# Altium footprint library Footprint.PcbLib: 55 footprints (part 2 of 4)
Each footprint in its own frame and in the unit in brackets; x right, y up, seen from the top. Pads: shape width x height; smd on the part's side, far side on the other; paste and mask are expansions set on the pad; w line width, h text height; cw(c..) or ccw(c..) is an arc to the next point about the centre after c.
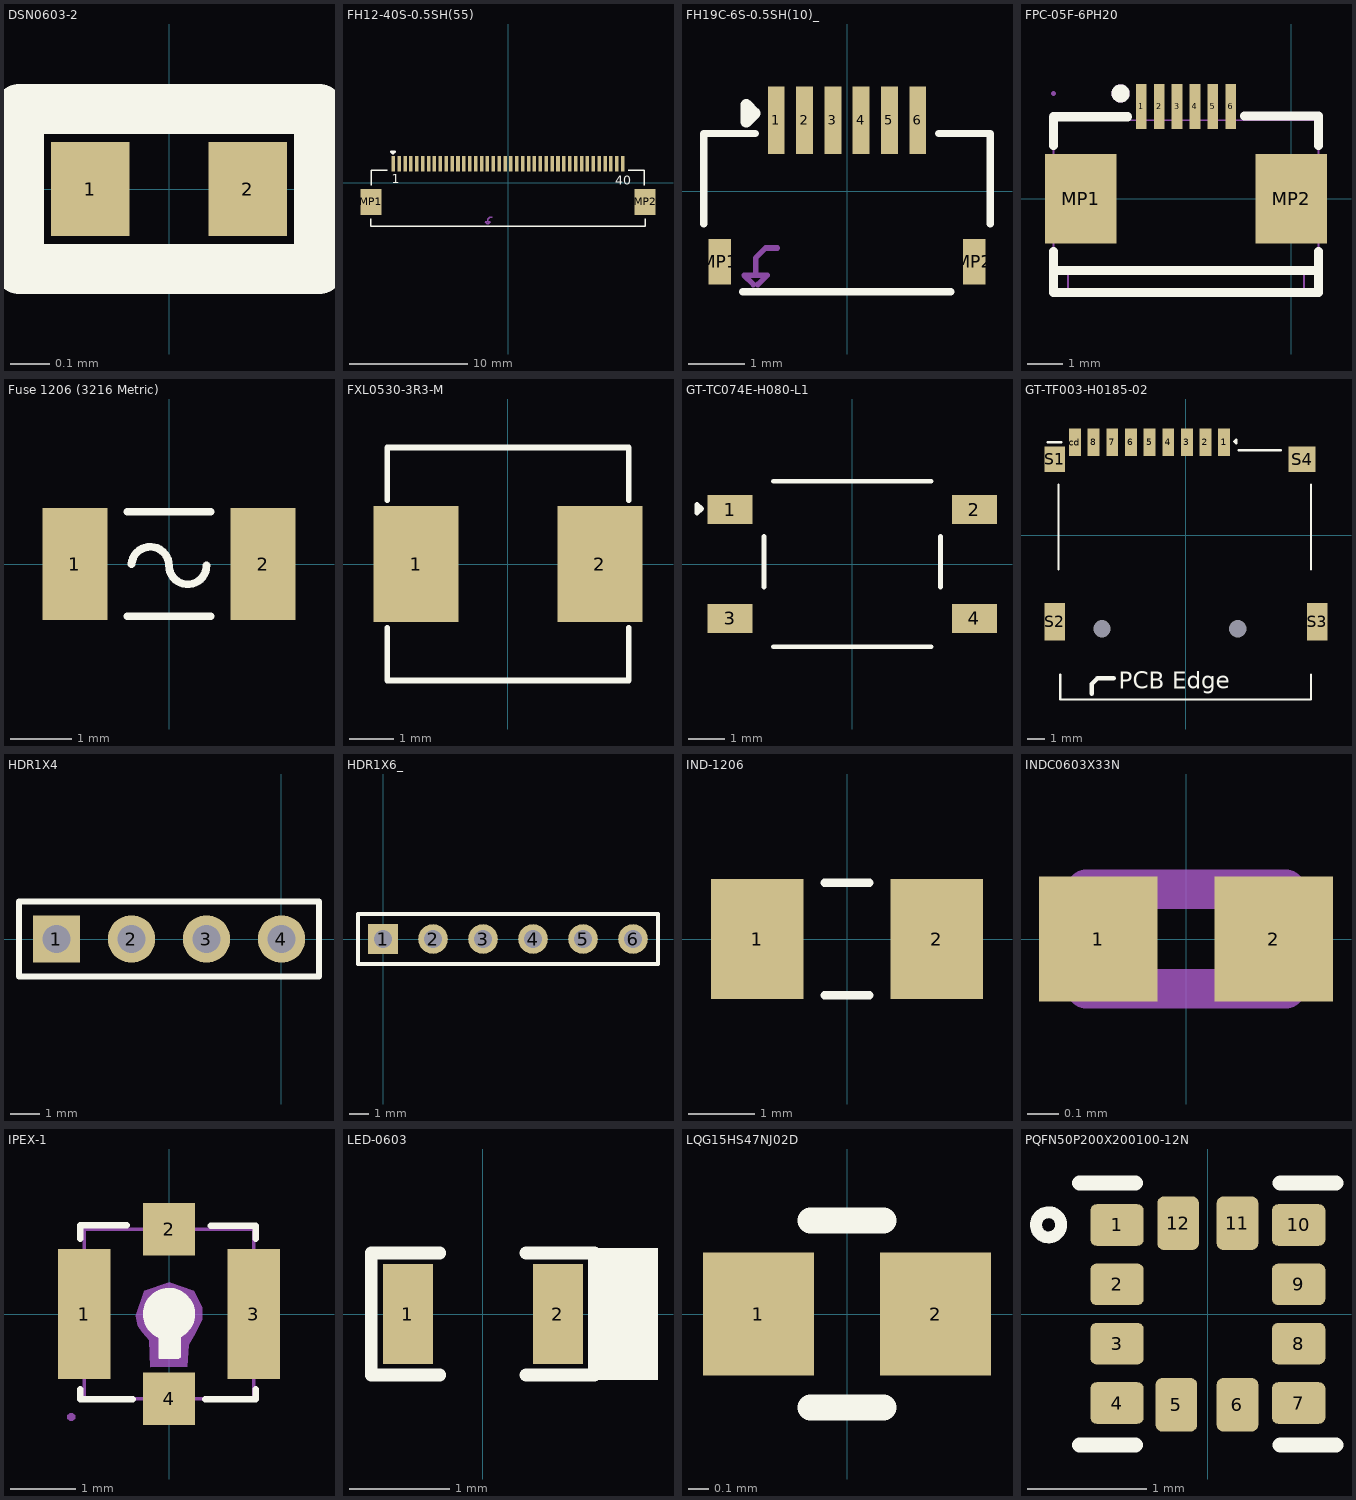
[diagram p1: the footprints below, top view; thin cyan lines are the x and y axes]

## DSN0603-2 [mm]
pads (2):
  rect 0.2x0.24 smd mask+0.055: 1(-0.2,0) 2(0.2,0)
Top Overlay:
  lines w0.127: -0.381,-0.203 -0.381,0.203 0.381,0.203 0.381,-0.203 -0.381,-0.203
3D body "PESD5V0H1BSF.STEP": height 0.32, standoff 0, extent -0.3,-0.15 0.3,0.15

## FH12-40S-0.5SH(55) [mm]
pads (42):
  rect 0.3x1.3 smd: 1(-9.75,1.625) 2(-9.25,1.625) 3(-8.75,1.625) 4(-8.25,1.625) 5(-7.75,1.625) 6(-7.25,1.625) 7(-6.75,1.625) 8(-6.25,1.625) 9(-5.75,1.625) 10(-5.25,1.625) 11(-4.75,1.625) 12(-4.25,1.625) 13(-3.75,1.625) 14(-3.25,1.625) 15(-2.75,1.625) 16(-2.25,1.625) 17(-1.75,1.625) 18(-1.25,1.625) 19(-0.75,1.625) 20(-0.25,1.625) 21(0.25,1.625) 22(0.75,1.625) 23(1.25,1.625) 24(1.75,1.625) 25(2.25,1.625) 26(2.75,1.625) 27(3.25,1.625) 28(3.75,1.625) 29(4.25,1.625) 30(4.75,1.625) 31(5.25,1.625) 32(5.75,1.625) 33(6.25,1.625) 34(6.75,1.625) 35(7.25,1.625) 36(7.75,1.625) 37(8.25,1.625) 38(8.75,1.625) 39(9.25,1.625) 40(9.75,1.625)
  rect 1.8x2.2 smd: MP1(-11.65,-1.625) MP2(11.65,-1.625)
Top Overlay:
  lines w0.127: -11.65,-3.049 -11.65,-3.708 11.65,-3.708 11.65,-3.049 ; -11.625,-0.201 -11.625,1.074 -10.25,1.074 ; 10.224,1.074 11.599,1.074 11.599,-0.201
  lines w0.2: -9.933,2.642 -9.628,2.642 -9.78,2.489 -9.933,2.642
  text "40" at 9.119,-0.152 h0.76
  text "1" at -9.881,-0.051 h0.76
Mechanical 13:
  lines w0.127: -1.346,-2.946 -1.549,-2.946 -1.727,-3.124 -1.727,-3.327 ; -1.727,-3.327 -1.524,-3.327 -1.687,-3.491 -1.767,-3.491 -1.93,-3.327 -1.727,-3.327
  text "PCB Edge" at -1.197,-3.276 h0.8
3D body "Conn_Hirose_FH12-40S-0_5SH_55_eec.STEP": height 4.8, standoff 0, extent -12.05,-3.654 12.05,1.746

## FH19C-6S-0.5SH(10)_ [mm]
pads (8):
  rect 0.3x1.2 smd: 1(-1.25,1.25) 2(-0.75,1.25) 3(-0.25,1.25) 4(0.25,1.25) 5(0.75,1.25) 6(1.25,1.25)
  rect 0.4x0.8 smd: MP1(-2.25,-1.25) MP2(2.25,-1.25)
Top Overlay:
  lines w0.127: -2.532,-0.584 -2.532,1.016 -1.618,1.016 ; -1.846,-1.778 1.837,-1.778 ; 1.618,1.016 2.532,1.016 2.532,-0.584
  lines w0.2: -1.778,1.219 -1.626,1.372 -1.778,1.524 -1.778,1.219
Mechanical 13:
  lines w0.1: -1.655,-1.651 -1.818,-1.488 -1.615,-1.488 ; -1.575,-1.651 -1.412,-1.488 -1.615,-1.488 ; -1.234,-1.005 -1.437,-1.005 -1.615,-1.183 -1.615,-1.488
  text "PCB Edge" at -1.135,-1.246 h0.6
3D body "FH19C-6S-0.5SH.stp": height 0.9, standoff 0, extent -2.503,-2.032 2.497,1.468

## FPC-05F-6PH20 [mm]
pads (8):
  rect 0.3x1.25 smd paste+0 mask+0.05: 1(-4.19,2.575) 2(-3.69,2.575) 3(-3.19,2.575) 4(-2.69,2.575) 5(-2.19,2.575) 6(-1.69,2.575)
  rect 2x2.5 smd paste+0 mask+0.05: MP1(-5.88,0) MP2(0,0)
Top Overlay:
  circle w0.254: c-4.767,2.939 r0.127
  lines w0.254: -6.64,-1.481 -6.64,-2.625 0.76,-2.625 0.76,-1.481 ; -6.64,1.481 -6.64,2.288 -4.571,2.288 ; -6.49,-2.012 0.76,-2.012 ; -1.309,2.304 0.76,2.304 0.76,1.481
Mechanical 6:
  circle w0.254: c-4.767,2.939 r0.127
Mechanical 15:
  region: -4.29,2.937 -4.29,2.087 -4.09,2.087 -4.09,2.937
  region: -3.79,2.937 -3.79,2.087 -3.59,2.087 -3.59,2.937
  region: -3.29,2.937 -3.29,2.087 -3.09,2.087 -3.09,2.937
  region: -2.79,2.937 -2.79,2.087 -2.59,2.087 -2.59,2.937
  region: -2.29,2.938 -2.29,2.088 -2.09,2.088 -2.09,2.938
  region: -1.79,2.938 -1.79,2.088 -1.59,2.088 -1.59,2.938
  region: -6.58,2.938 -6.581,2.962 -6.616,2.996 -6.664,2.996 -6.699,2.962 -6.7,2.937 -6.699,2.913 -6.664,2.879 -6.616,2.879 -6.581,2.913
  lines w0.051: -6.64,-2.012 -5.59,-2.012 -5.59,-2.062 -6.19,-2.062 -6.24,-2.112 -6.24,-2.612 -6.19,-2.662 0.31,-2.662 0.36,-2.612 0.36,-2.112 0.31,-2.062 -0.29,-2.062 -0.29,-2.012 0.76,-2.012 0.76,1.288 0.76,2.088 0.66,2.188 -6.54,2.188 -6.64,2.088 -6.64,-2.012

## Fuse 1206 (3216 Metric) [mm] "0.126\" L x 0.062\" W x 0.026\" H (3.20mm x 1.58mm x 0.65mm)"
pads (2):
  rect 1.06x1.82 smd: 1(-1.528,0) 2(1.528,0)
Top Overlay:
  lines w0.127: -0.68,-0.849 0.68,-0.849 ; -0.68,0.849 0.68,0.849 ; -0.609,-0.002 cw(c-0.305,-0.025) 0,-0.025 ccw(c0.305,-0.025) 0.61,-0.025
3D body "0685H9150-01.STEP": height 0.85, standoff 0, extent -1.6,-0.79 1.6,0.79

## FXL0530-3R3-M [mm]
pads (2):
  rect 1.9x2.6 smd: 1(-2.05,0) 2(2.05,0)
Top Overlay:
  lines w0.127: -2.7,-1.422 -2.7,-2.6 2.7,-2.6 2.7,-1.422 ; -2.7,1.422 -2.7,2.6 2.7,2.6 2.7,1.422
3D body: height 0.5, standoff 0, extent -2.85,-1.1 -1.65,1.1
3D body: height 0.5, standoff 0, extent 1.65,-1.1 2.85,1.1
3D body: height 3, standoff 0, extent -2.692,-2.591 2.692,2.591

## GT-TC074E-H080-L1 [mm]
pads (4):
  rect 1.25x0.8 smd: 1(-3.375,1.5) 2(3.375,1.5) 3(-3.375,-1.5) 4(3.375,-1.5)
Top Overlay:
  lines w0.127: -2.438,-0.635 -2.438,0.762 ; -2.184,-2.286 2.184,-2.286 ; -2.184,2.286 2.184,2.286 ; 2.438,-0.635 2.438,0.762 ; -4.289,1.398 -4.162,1.525 -4.289,1.652 -4.289,1.398
3D body "G-Switch GT-TC074E-H080-L1.STEP": height 8, standoff 0, extent -3.75,-2.255 3.75,2.245

## GT-TF003-H0185-02 [mm]
pads (15):
  rect 0.7x1.6 smd: 1(2.25,5.5) 2(1.15,5.5) 3(0.05,5.5) 4(-1.05,5.5) 5(-2.15,5.5) 6(-3.25,5.5) 7(-4.35,5.5) 8(-5.45,5.5) cd(-6.55,5.5)
  round 0 hole 1.02 unplated: MH(-4.95,-5.5) MH1(3.05,-5.5)
  rect 1.2x1.5 smd: S1(-7.75,4.5)
  rect 1.2x2.2 smd: S2(-7.75,-5.1) S3(7.75,-5.1)
  rect 1.6x1.5 smd: S4(6.85,4.5)
Top Overlay:
  lines w0.127: -8.165,5.5 -7.345,5.5 ; -7.521,-2 -7.521,3 ; -7.421,-8.2 -7.421,-9.672 -0.026,-9.672 7.369,-9.672 7.369,-8.2 ; 3.099,5.029 5.599,5.029 ; 7.369,-2 7.369,3 ; 2.839,5.541 2.966,5.414 2.966,5.668 2.839,5.541
  lines w0.254: -5.563,-9.347 -5.563,-8.763 -5.232,-8.433 -4.267,-8.433
  text "PCB Edge" at -3.962,-9.039 h1
3D body "sd card.STEP": height 1.9, standoff -0.4, extent -8.18,-9.583 8,5.717

## HDR1X4 [mm]
pads (4):
  rect 1.6x1.6 hole 0.95: 1(-7.62,0)
  round 1.6 hole 0.95: 2(-5.08,0) 3(-2.54,0) 4(0,0)
Top Overlay:
  lines w0.2: -8.89,-1.27 1.27,-1.27 1.27,1.27 -8.89,1.27 -8.89,-1.27
3D body "User Library-1x4 TH Pitch 2_54mm.STEP": height 9.5, standoff -3.2, extent -8.89,-1.27 1.27,1.27

## HDR1X6_ [mm] "Connector; Header; 6 Position"
pads (6):
  rect 1.5x1.5 hole 0.9: 1(0,0)
  round 1.5 hole 0.9: 2(2.54,0) 3(5.08,0) 4(7.62,0) 5(10.16,0) 6(12.7,0)
Top Overlay:
  lines w0.2: -1.27,-1.27 -1.27,1.27 13.97,1.27 13.97,-1.27 -1.27,-1.27
3D body "User Library-Header_Male_6Pin.STEP": height 8.54, standoff -3, extent -1.27,-1.245 13.97,1.245

## IND-1206 [mm]
pads (2):
  rect 1.4x1.82 smd: 1(-1.36,0) 2(1.36,0)
Top Overlay:
  lines w0.127: -0.34,-0.849 0.34,-0.849 ; -0.34,0.849 0.34,0.849
3D body "BLM31PG121SN1L.STEP": height 1.3, standoff 0, extent -1.6,-0.8 1.6,0.8

## INDC0603X33N [mm]
pads (2):
  rect 0.38x0.4 smd: 1(-0.281,0) 2(0.281,0)
Mechanical 13:
  lines w0.127: -0.32,-0.16 -0.32,0.16 0.32,0.16 0.32,-0.16 -0.32,-0.16
3D body "step_temp.STEP": height 0.33, standoff 0, extent -0.3,-0.15 0.3,0.15

## IPEX-1 [mm]
pads (4):
  rect 0.8x2 smd paste+0 mask+0.05: 1(-1.3,0) 3(1.3,0)
  rect 0.8x0.8 smd paste+0 mask+0.05: 2(0,1.3) 4(0,-1.3)
Top Overlay:
  circle w0.4: c0,0 r0.2
  region: 0.18,-0.66 0.18,-0.342 0.17,-0.332 -0.16,-0.332 -0.16,-0.678 -0.15,-0.688 0.152,-0.688 0.18,-0.66
  lines w0.1: -1.36,-1.154 -1.36,-1.31 -0.554,-1.31 ; -1.36,1.154 -1.36,1.36 -0.65,1.36 ; 0.554,-1.31 1.33,-1.31 1.33,-1.154 ; 0.64,1.35 1.33,1.35 1.33,1.154
Mechanical 6:
  region: 0.28,-0.81 0.3,-0.469 0.381,-0.342 0.508,-0.088 0.508,0.102 0.381,0.356 0,0.483 -0.381,0.356 -0.508,-0.025 -0.48,-0.18 -0.41,-0.28 -0.3,-0.406 -0.29,-0.82
Mechanical 15:
  region: -0.29,-1.28 0.28,-1.28 0.28,-1.58 -0.29,-1.58
  region: 0.28,1.22 -0.29,1.22 -0.29,1.52 0.28,1.52
  region: -1.12,0.88 -1.12,-0.88 -1.5,-0.88 -1.5,0.88
  region: 1.5,0.88 1.5,-0.88 1.12,-0.88 1.12,0.88
  region: -1.44,-1.58 -1.441,-1.556 -1.476,-1.521 -1.525,-1.521 -1.56,-1.556 -1.56,-1.58 -1.56,-1.605 -1.524,-1.639 -1.476,-1.639 -1.441,-1.605
  lines w0.051: -1.3,-1.3 1.3,-1.3 1.3,1.3 -1.3,1.3 -1.3,-1.3
3D body "20279-001E-03--3DModel-STEP-56544.STEP": height 1.26, standoff 0.01, extent -1.5,-1.55 1.5,1.55

## LED-0603 [mm]
pads (2):
  rect 0.5x1 smd: 1(-0.75,0) 2(0.75,0)
Top Overlay:
  rectangle: 1.118,-0.66 1.753,0.66
  lines w0.127: -0.432,-0.61 -1.118,-0.61 -1.118,0.61 -0.432,0.61 ; 0.432,-0.61 1.118,-0.61 1.118,0.61 0.432,0.61
3D body "User Library-LED SMD0603.step": height 0.68, standoff 0, extent -0.825,-0.369 0.825,0.356

## LQG15HS47NJ02D [mm]
pads (2):
  rect 0.54x0.6 smd: 1(-0.432,0) 2(0.432,0)
Top Overlay:
  lines w0.127: -0.178,-0.457 0.178,-0.457 ; -0.178,0.457 0.178,0.457
3D body "LQG15HS47NJ02D.STEP": height 0.5, standoff 0, extent -0.5,-0.275 0.5,0.275

## PQFN50P200X200100-12N [mm]
pads (12):
  rrect30% 0.45x0.35 smd: 1(-0.765,0.75) 2(-0.765,0.25) 3(-0.765,-0.25) 4(-0.765,-0.75) 7(0.765,-0.75) 8(0.765,-0.25) 9(0.765,0.25) 10(0.765,0.75)
  rrect30% 0.35x0.45 smd: 5(-0.265,-0.765) 6(0.25,-0.765) 11(0.25,0.765) 12(-0.25,0.765)
Top Overlay:
  circle w0.1: c-1.342,0.752 r0.106
  lines w0.127: -1.08,-1.105 -0.61,-1.105 ; -1.08,1.105 -0.61,1.105 ; 0.61,-1.105 1.08,-1.105 ; 0.61,1.105 1.08,1.105
3D body "step_temp.STEP": height 1, standoff 0, extent -1,-1 1,1